# Altium footprint library Test.PcbLib: 245 footprints (part 17 of 17)
Each footprint in its own frame and in the unit in brackets; x right, y up, seen from the top. Pads: shape width x height; smd on the part's side, far side on the other; paste and mask are expansions set on the pad; w line width, h text height; cw(c..) or ccw(c..) is an arc to the next point about the centre after c.
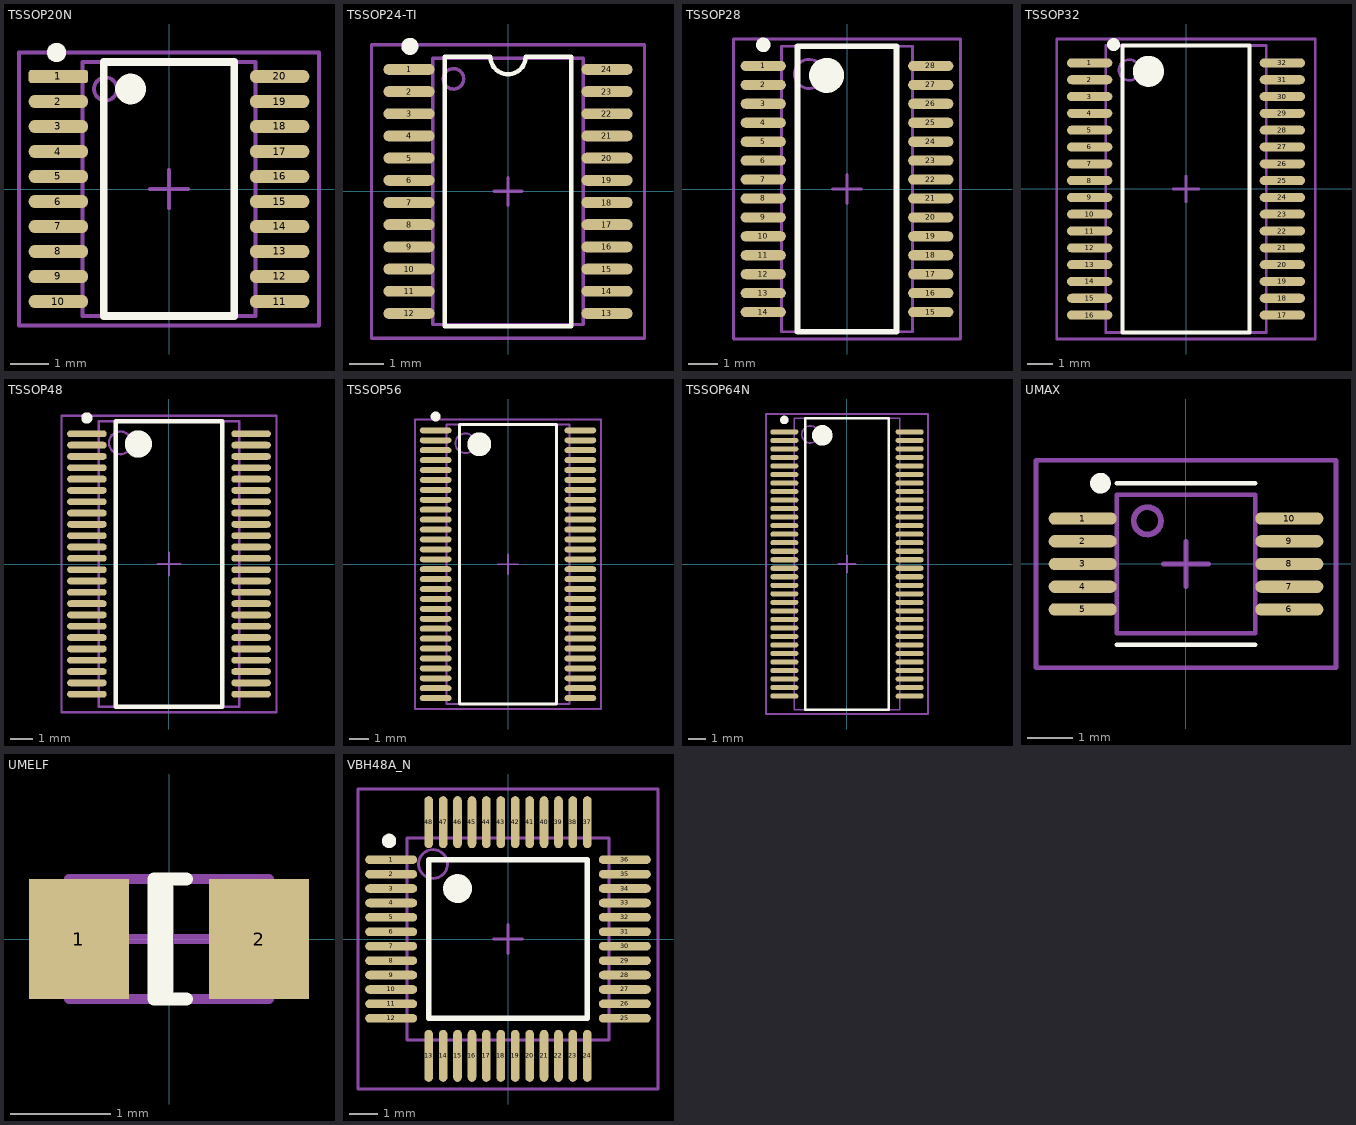
[diagram p16: the footprints below, top view; thin cyan lines are the x and y axes]

## TSSOP20N [mm] "TSSOP 20, Body 6,6x4,5mm, R0,65mm, IPC Medium Density"
height 1.2
pads (20):
  rrect50% 1.55x0.35 smd mask+0.051: 1(-2.875,2.925)
  oval 1.55x0.35 smd mask+0.051: 2(-2.875,2.275) 3(-2.875,1.625) 4(-2.875,0.975) 5(-2.875,0.325) 6(-2.875,-0.325) 7(-2.875,-0.975) 8(-2.875,-1.625) 9(-2.875,-2.275) 10(-2.875,-2.925) 11(2.875,-2.925) 12(2.875,-2.275) 13(2.875,-1.625) 14(2.875,-0.975) 15(2.875,-0.325) 16(2.875,0.325) 17(2.875,0.975) 18(2.875,1.625) 19(2.875,2.275) 20(2.875,2.925)
Top Overlay:
  circle w0.4: c-1,2.6 r0.2
  circle w0.25: c-2.925,3.55 r0.125
  lines w0.2: -1.7,-3.3 1.7,-3.3 1.7,3.3 -1.7,3.3 -1.7,-3.3
Mechanical 13:
  circle w0.1: c-1.65,2.6 r0.3
  lines w0.1: -2.25,-3.3 2.25,-3.3 2.25,3.3 -2.25,3.3 -2.25,-3.3
Mechanical 15:
  lines w0.1: -0.5,0 0.5,0 ; 0,-0.5 0,0.5 ; -3.9,-3.55 3.9,-3.55 3.9,3.55 -3.9,3.55 -3.9,-3.55
3D body: height 1.2, standoff 0.05, extent -2.25,-3.3 2.25,3.3

## TSSOP24-TI [mm] "Plastic Small Outline 24pin R0.65mm 7.8x4.4x1.2mm"
height 1.2
pads (24):
  oval 1.5x0.32 smd mask+0.051: 1(-2.9,3.575) 2(-2.9,2.925) 3(-2.9,2.275) 4(-2.9,1.625) 5(-2.9,0.975) 6(-2.9,0.325) 7(-2.9,-0.325) 8(-2.9,-0.975) 9(-2.9,-1.625) 10(-2.9,-2.275) 11(-2.9,-2.925) 12(-2.9,-3.575) 13(2.9,-3.575) 14(2.9,-2.925) 15(2.9,-2.275) 16(2.9,-1.625) 17(2.9,-0.975) 18(2.9,-0.325) 19(2.9,0.325) 20(2.9,0.975) 21(2.9,1.625) 22(2.9,2.275) 23(2.9,2.925) 24(2.9,3.575)
Top Overlay:
  circle w0.25: c-2.875,4.25 r0.125
  lines w0.127: -1.85,-3.95 1.85,-3.95 1.85,3.95 0.517,3.95 cw(c0,3.95) -0.517,3.95 -1.85,3.95 -1.85,-3.95
Mechanical 13:
  circle w0.102: c-1.6,3.3 r0.3
  lines w0.102: -2.2,-3.9 -2.2,3.9 2.2,3.9 2.2,-3.9 -2.2,-3.9
Mechanical 15:
  lines w0.102: -0.4,0 0.4,0 ; 0,-0.4 0,0.4 ; -4,-4.3 4,-4.3 4,4.3 -4,4.3 -4,-4.3
3D body: height 1.21, standoff 1.2, extent -1.906,2.994 -1.294,3.606
3D body: height 1.2, standoff 0, extent -2.2,-3.9 2.2,3.9

## TSSOP28 [mm] "TSSOP, 28-Leads, Body 9,8x4,5mm (max), Pitch 0,65mm, IPC Medium Density"
height 1.2
pads (28):
  oval 1.55x0.35 smd mask+0.051: 1(-2.875,4.225) 2(-2.875,3.575) 3(-2.875,2.925) 4(-2.875,2.275) 5(-2.875,1.625) 6(-2.875,0.975) 7(-2.875,0.325) 8(-2.875,-0.325) 9(-2.875,-0.975) 10(-2.875,-1.625) 11(-2.875,-2.275) 12(-2.875,-2.925) 13(-2.875,-3.575) 14(-2.875,-4.225) 15(2.875,-4.225) 16(2.875,-3.575) 17(2.875,-2.925) 18(2.875,-2.275) 19(2.875,-1.625) 20(2.875,-0.975) 21(2.875,-0.325) 22(2.875,0.325) 23(2.875,0.975) 24(2.875,1.625) 25(2.875,2.275) 26(2.875,2.925) 27(2.875,3.575) 28(2.875,4.225)
Top Overlay:
  circle w0.6: c-0.7,3.9 r0.3
  circle w0.25: c-2.875,4.95 r0.125
  lines w0.2: -1.7,-4.9 1.7,-4.9 1.7,4.9 -1.7,4.9 -1.7,-4.9
Mechanical 13:
  circle w0.1: c-1.3,3.95 r0.5
  lines w0.1: -2.25,-4.9 2.25,-4.9 2.25,4.9 -2.25,4.9 -2.25,-4.9
Mechanical 15:
  lines w0.1: -0.5,0 0.5,0 ; 0,-0.5 0,0.5 ; -3.9,-5.15 3.9,-5.15 3.9,5.15 -3.9,5.15 -3.9,-5.15
3D body: height 1.2, standoff 0.15, extent -2.25,-4.9 2.25,4.9
3D body: height 1.21, standoff 1.2, extent -2.025,4.05 -1.627,4.449

## TSSOP32 [mm] "TSSOP, 32-Leads, Body 11,1x6,2mm (max), Pitch 0,65mm, IPC Medium Density"
height 1.2
pads (32):
  oval 1.75x0.35 smd mask+0.051: 1(-3.725,4.875) 2(-3.725,4.225) 3(-3.725,3.575) 4(-3.725,2.925) 5(-3.725,2.275) 6(-3.725,1.625) 7(-3.725,0.975) 8(-3.725,0.325) 9(-3.725,-0.325) 10(-3.725,-0.975) 11(-3.725,-1.625) 12(-3.725,-2.275) 13(-3.725,-2.925) 14(-3.725,-3.575) 15(-3.725,-4.225) 16(-3.725,-4.875) 17(3.725,-4.875) 18(3.725,-4.225) 19(3.725,-3.575) 20(3.725,-2.925) 21(3.725,-2.275) 22(3.725,-1.625) 23(3.725,-0.975) 24(3.725,-0.325) 25(3.725,0.325) 26(3.725,0.975) 27(3.725,1.625) 28(3.725,2.275) 29(3.725,2.925) 30(3.725,3.575) 31(3.725,4.225) 32(3.725,4.875)
Top Overlay:
  circle w0.6: c-1.45,4.55 r0.3
  circle w0.25: c-2.8,5.585 r0.125
  lines w0.15: -2.45,-5.55 2.45,-5.55 2.45,5.55 -2.45,5.55 -2.45,-5.55
Mechanical 13:
  circle w0.1: c-2.2,4.6 r0.4
  lines w0.1: -3.1,-5.55 3.1,-5.55 3.1,5.55 -3.1,5.55 -3.1,-5.55
Mechanical 15:
  lines w0.1: -0.5,0 0.5,0 ; 0,-0.5 0,0.5 ; -5,-5.8 5,-5.8 5,5.8 -5,5.8 -5,-5.8
3D body: height 1.2, standoff 0.1, extent -3.1,-5.55 3.1,5.55
3D body: height 1.21, standoff 1.2, extent -2.608,4.192 -1.792,5.008

## TSSOP48 [mm] "TSSOP, 48-Leads, Body 12,6x6,2mm (max), Pitch 0,50mm, IPC Medium Density"
height 1.2
pads (48):
  oval 1.75x0.3 smd mask+0.051: 1(-3.625,5.75) 2(-3.625,5.25) 3(-3.625,4.75) 4(-3.625,4.25) 5(-3.625,3.75) 6(-3.625,3.25) 7(-3.625,2.75) 8(-3.625,2.25) 9(-3.625,1.75) 10(-3.625,1.25) 11(-3.625,0.75) 12(-3.625,0.25) 13(-3.625,-0.25) 14(-3.625,-0.75) 15(-3.625,-1.25) 16(-3.625,-1.75) 17(-3.625,-2.25) 18(-3.625,-2.75) 19(-3.625,-3.25) 20(-3.625,-3.75) 21(-3.625,-4.25) 22(-3.625,-4.75) 23(-3.625,-5.25) 24(-3.625,-5.75) 25(3.625,-5.75) 26(3.625,-5.25) 27(3.625,-4.75) 28(3.625,-4.25) 29(3.625,-3.75) 30(3.625,-3.25) 31(3.625,-2.75) 32(3.625,-2.25) 33(3.625,-1.75) 34(3.625,-1.25) 35(3.625,-0.75) 36(3.625,-0.25) 37(3.625,0.25) 38(3.625,0.75) 39(3.625,1.25) 40(3.625,1.75) 41(3.625,2.25) 42(3.625,2.75) 43(3.625,3.25) 44(3.625,3.75) 45(3.625,4.25) 46(3.625,4.75) 47(3.625,5.25) 48(3.625,5.75)
Top Overlay:
  circle w0.6: c-1.35,5.3 r0.3
  circle w0.25: c-3.625,6.45 r0.125
  lines w0.2: -2.35,-6.3 2.35,-6.3 2.35,6.3 -2.35,6.3 -2.35,-6.3
Mechanical 13:
  circle w0.1: c-2.15,5.35 r0.5
  lines w0.1: -3.1,-6.3 3.1,-6.3 3.1,6.3 -3.1,6.3 -3.1,-6.3
Mechanical 15:
  lines w0.1: -0.5,0 0.5,0 ; 0,-0.5 0,0.5 ; -4.75,-6.55 4.75,-6.55 4.75,6.55 -4.75,6.55 -4.75,-6.55
3D body: height 1.2, standoff 0.15, extent -3.1,-6.3 3.1,6.3
3D body: height 1.21, standoff 1.2, extent -2.657,4.851 -1.661,5.849

## TSSOP56 [mm] "TSSOP 56pin R0.5mm"
height 1.2
pads (56):
  oval 1.6x0.3 smd mask+0.051: 1(-3.65,6.75) 2(-3.65,6.25) 3(-3.65,5.75) 4(-3.65,5.25) 5(-3.65,4.75) 6(-3.65,4.25) 7(-3.65,3.75) 8(-3.65,3.25) 9(-3.65,2.75) 10(-3.65,2.25) 11(-3.65,1.75) 12(-3.65,1.25) 13(-3.65,0.75) 14(-3.65,0.25) 15(-3.65,-0.25) 16(-3.65,-0.75) 17(-3.65,-1.25) 18(-3.65,-1.75) 19(-3.65,-2.25) 20(-3.65,-2.75) 21(-3.65,-3.25) 22(-3.65,-3.75) 23(-3.65,-4.25) 24(-3.65,-4.75) 25(-3.65,-5.25) 26(-3.65,-5.75) 27(-3.65,-6.25) 28(-3.65,-6.75) 29(3.65,-6.75) 30(3.65,-6.25) 31(3.65,-5.75) 32(3.65,-5.25) 33(3.65,-4.75) 34(3.65,-4.25) 35(3.65,-3.75) 36(3.65,-3.25) 37(3.65,-2.75) 38(3.65,-2.25) 39(3.65,-1.75) 40(3.65,-1.25) 41(3.65,-0.75) 42(3.65,-0.25) 43(3.65,0.25) 44(3.65,0.75) 45(3.65,1.25) 46(3.65,1.75) 47(3.65,2.25) 48(3.65,2.75) 49(3.65,3.25) 50(3.65,3.75) 51(3.65,4.25) 52(3.65,4.75) 53(3.65,5.25) 54(3.65,5.75) 55(3.65,6.25) 56(3.65,6.75)
Top Overlay:
  circle w0.25: c-3.65,7.45 r0.125
  circle w0.6: c-1.45,6.05 r0.3
  lines w0.15: -2.45,-7.05 -2.45,7.05 2.45,7.05 2.45,-7.05 -2.45,-7.05
Mechanical 13:
  circle w0.1: c-2.15,6.1 r0.5
  lines w0.1: -3.1,-7.05 -3.1,7.05 3.1,7.05 3.1,-7.05 -3.1,-7.05
Mechanical 15:
  lines w0.1: -0.5,0 0.5,0 ; 0,-0.5 0,0.5 ; -4.7,-7.3 -4.7,7.3 4.7,7.3 4.7,-7.3 -4.7,-7.3
3D body: height 1.2, standoff 0.1, extent -3.1,-7.05 3.1,7.05
3D body: height 1.21, standoff 1.2, extent -2.66,5.59 -1.64,6.61

## TSSOP64N [mm] "TSSOP, 64-Leads, Body 17,1x6,2mm (max), Pitch 0,50mm, IPC Medium Density"
height 1.2
pads (64):
  oval 1.65x0.3 smd mask+0.051: 1(-3.675,7.75) 2(-3.675,7.25) 3(-3.675,6.75) 4(-3.675,6.25) 5(-3.675,5.75) 6(-3.675,5.25) 7(-3.675,4.75) 8(-3.675,4.25) 9(-3.675,3.75) 10(-3.675,3.25) 11(-3.675,2.75) 12(-3.675,2.25) 13(-3.675,1.75) 14(-3.675,1.25) 15(-3.675,0.75) 16(-3.675,0.25) 17(-3.675,-0.25) 18(-3.675,-0.75) 19(-3.675,-1.25) 20(-3.675,-1.75) 21(-3.675,-2.25) 22(-3.675,-2.75) 23(-3.675,-3.25) 24(-3.675,-3.75) 25(-3.675,-4.25) 26(-3.675,-4.75) 27(-3.675,-5.25) 28(-3.675,-5.75) 29(-3.675,-6.25) 30(-3.675,-6.75) 31(-3.675,-7.25) 32(-3.675,-7.75) 33(3.675,-7.75) 34(3.675,-7.25) 35(3.675,-6.75) 36(3.675,-6.25) 37(3.675,-5.75) 38(3.675,-5.25) 39(3.675,-4.75) 40(3.675,-4.25) 41(3.675,-3.75) 42(3.675,-3.25) 43(3.675,-2.75) 44(3.675,-2.25) 45(3.675,-1.75) 46(3.675,-1.25) 47(3.675,-0.75) 48(3.675,-0.25) 49(3.675,0.25) 50(3.675,0.75) 51(3.675,1.25) 52(3.675,1.75) 53(3.675,2.25) 54(3.675,2.75) 55(3.675,3.25) 56(3.675,3.75) 57(3.675,4.25) 58(3.675,4.75) 59(3.675,5.25) 60(3.675,5.75) 61(3.675,6.25) 62(3.675,6.75) 63(3.675,7.25) 64(3.675,7.75)
Top Overlay:
  circle w0.6: c-1.45,7.55 r0.3
  circle w0.25: c-3.675,8.45 r0.125
  lines w0.127: -2.45,-8.55 2.45,-8.55 2.45,8.55 -2.45,8.55 -2.45,-8.55
Mechanical 13:
  circle w0.1: c-2.15,7.6 r0.5
  lines w0.1: -3.1,-8.55 3.1,-8.55 3.1,8.55 -3.1,8.55 -3.1,-8.55
Mechanical 15:
  lines w0.1: -0.5,0 0.5,0 ; 0,-0.5 0,0.5 ; -4.75,-8.8 4.75,-8.8 4.75,8.8 -4.75,8.8 -4.75,-8.8
3D body: height 1.21, standoff 1.2, extent -2.677,7.102 -1.64,8.138
3D body: height 1.2, standoff 0.1, extent -3.1,-8.55 3.1,8.55

## UMAX [mm] "uMAX/uSOP 10pin, Body 3.05x3.05mm (max), Pitch 0,5mm"
height 1.1
pads (10):
  oval 1.5x0.27 smd mask+0.051: 1(-2.275,1) 2(-2.275,0.5) 3(-2.275,0) 4(-2.275,-0.5) 5(-2.275,-1) 6(2.275,-1) 7(2.275,-0.5) 8(2.275,0) 9(2.275,0.5) 10(2.275,1)
Top Overlay:
  circle w0.254: c-1.883,1.778 r0.1
  lines w0.102: -1.524,-1.778 1.524,-1.778 ; -1.524,1.778 1.524,1.778
Mechanical 13:
  circle w0.127: c-0.85,0.95 r0.3
  lines w0.102: -1.525,-1.525 1.525,-1.525 1.525,1.525 -1.525,1.525 -1.525,-1.525
Mechanical 15:
  lines w0.102: -0.5,0 0.5,0 ; 0,-0.5 0,0.5 ; -3.302,-2.286 3.302,-2.286 3.302,2.286 -3.302,2.286 -3.302,-2.286
3D body: height 1.1, standoff 0.1, extent -1.525,-1.525 1.525,1.525
3D body: height 1.12, standoff 1.1, extent -1.156,0.644 -0.544,1.256

## UMELF [mm] "micro melf  D1.2x2.0mm"
height 1.2
pads (2):
  rect 1x1.2 smd: 1(-0.9,0) 2(0.9,0)
Top Overlay:
  lines w0.127: 0.175,-0.6 -0.15,-0.6 -0.15,0.6 0.175,0.6 ; -0.025,-0.575 -0.025,0.6 -0.025,-0.575
Mechanical 13:
  lines w0.102: -0.75,0.6 -0.75,-0.6 -0.65,-0.6 -0.65,0.6 -0.55,0.6 -0.55,-0.6 -0.45,-0.6 -0.45,0.6 ; -1,-0.6 -1,0 -1,0.6 1,0.6 1,-0.6 -1,-0.6
Mechanical 15:
  lines w0.102: -0.508,0 0.508,0 ; 0,-0.508 0,0.508
3D body: height 1.2, standoff 0, extent -1,-0.6 -0.75,0.598
3D body: height 1.2, standoff 0, extent -0.75,-0.6 -0.55,0.598
3D body: height 1.2, standoff 0, extent -0.55,-0.599 -0.25,0.599
3D body: height 1.2, standoff 0, extent 0.75,-0.598 1,0.6
3D body: height 1.2, standoff 0, extent -0.25,-0.599 0.75,0.599

## VBH48A_N [mm] "48-Pin Thin Quad Flat Pack 0.5 mm Pitch, IPC Medium Density"
height 1.6
pads (48):
  oval 1.8x0.3 smd mask+0.038: 1(-4.05,2.75) 2(-4.05,2.25) 3(-4.05,1.75) 4(-4.05,1.25) 5(-4.05,0.75) 6(-4.05,0.25) 7(-4.05,-0.25) 8(-4.05,-0.75) 9(-4.05,-1.25) 10(-4.05,-1.75) 11(-4.05,-2.25) 12(-4.05,-2.75) 25(4.05,-2.75) 26(4.05,-2.25) 27(4.05,-1.75) 28(4.05,-1.25) 29(4.05,-0.75) 30(4.05,-0.25) 31(4.05,0.25) 32(4.05,0.75) 33(4.05,1.25) 34(4.05,1.75) 35(4.05,2.25) 36(4.05,2.75)
  oval 0.3x1.8 smd mask+0.038: 13(-2.75,-4.05) 14(-2.25,-4.05) 15(-1.75,-4.05) 16(-1.25,-4.05) 17(-0.75,-4.05) 18(-0.25,-4.05) 19(0.25,-4.05) 20(0.75,-4.05) 21(1.25,-4.05) 22(1.75,-4.05) 23(2.25,-4.05) 24(2.75,-4.05) 37(2.75,4.05) 38(2.25,4.05) 39(1.75,4.05) 40(1.25,4.05) 41(0.75,4.05) 42(0.25,4.05) 43(-0.25,4.05) 44(-0.75,4.05) 45(-1.25,4.05) 46(-1.75,4.05) 47(-2.25,4.05) 48(-2.75,4.05)
Top Overlay:
  circle w0.5: c-1.75,1.75 r0.25
  circle w0.25: c-4.125,3.4 r0.125
  lines w0.2: -2.75,-2.75 2.75,-2.75 2.75,2.75 -2.75,2.75 -2.75,-2.75
Mechanical 13:
  circle w0.1: c-2.6,2.6 r0.5
  lines w0.1: -3.5,-3.5 3.5,-3.5 3.5,3.5 -3.5,3.5 -3.5,-3.5
Mechanical 15:
  lines w0.1: -0.5,0 0.5,0 ; 0,-0.5 0,0.5 ; -5.2,-5.2 5.2,-5.2 5.2,5.2 -5.2,5.2 -5.2,-5.2
3D body: height 1.61, standoff 1.6, extent -3.11,2.09 -2.09,3.11
3D body: height 1.6, standoff 0, extent -3.5,-3.5 3.5,3.5